# Altium footprint library Sajad_Altium_Library.PcbLib: 380 footprints (part 13 of 24)
Each footprint in its own frame and in the unit in brackets; x right, y up, seen from the top. Pads: shape width x height; smd on the part's side, far side on the other; paste and mask are expansions set on the pad; w line width, h text height; cw(c..) or ccw(c..) is an arc to the next point about the centre after c.
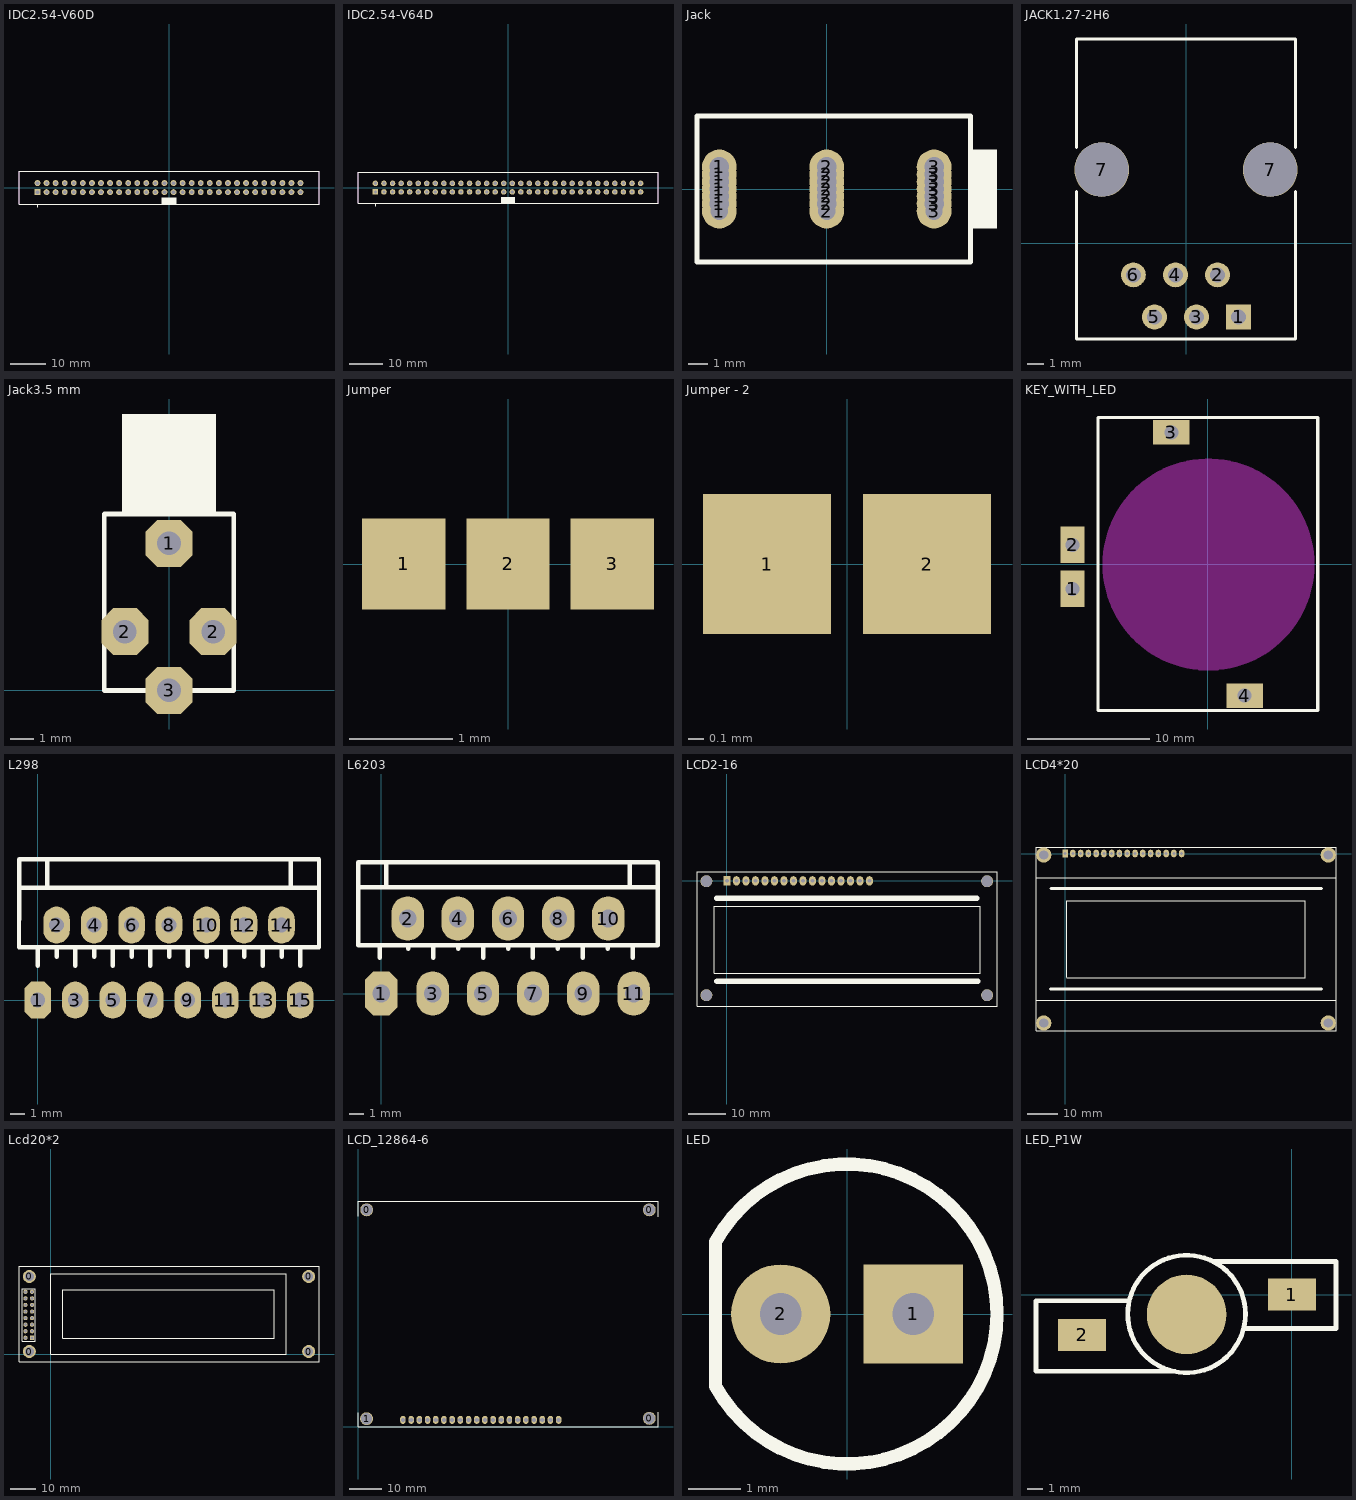
[diagram p12: the footprints below, top view; thin cyan lines are the x and y axes]

## IDC2.54-V60D [mm] "Connector; IDC, Low Profile Male Header, Thru-Hole; 60 Position; Vertical; Pitch 2.54 mm; Body 84.02 x 9.2 x 9.45 mm (LxWxH)"
height 9.45
pads (60):
  rect 1.65x1.65 hole 1: 1(-36.83,-1.27)
  round 1.65 hole 1: 2(-36.83,1.27) 3(-34.29,-1.27) 4(-34.29,1.27) 5(-31.75,-1.27) 6(-31.75,1.27) 7(-29.21,-1.27) 8(-29.21,1.27) 9(-26.67,-1.27) 10(-26.67,1.27) 11(-24.13,-1.27) 12(-24.13,1.27) 13(-21.59,-1.27) 14(-21.59,1.27) 15(-19.05,-1.27) 16(-19.05,1.27) 17(-16.51,-1.27) 18(-16.51,1.27) 19(-13.97,-1.27) 20(-13.97,1.27) 21(-11.43,-1.27) 22(-11.43,1.27) 23(-8.89,-1.27) 24(-8.89,1.27) 25(-6.35,-1.27) 26(-6.35,1.27) 27(-3.81,-1.27) 28(-3.81,1.27) 29(-1.27,-1.27) 30(-1.27,1.27) 31(1.27,-1.27) 32(1.27,1.27) 33(3.81,-1.27) 34(3.81,1.27) 35(6.35,-1.27) 36(6.35,1.27) 37(8.89,-1.27) 38(8.89,1.27) 39(11.43,-1.27) 40(11.43,1.27) 41(13.97,-1.27) 42(13.97,1.27) 43(16.51,-1.27) 44(16.51,1.27) 45(19.05,-1.27) 46(19.05,1.27) 47(21.59,-1.27) 48(21.59,1.27) 49(24.13,-1.27) 50(24.13,1.27) 51(26.67,-1.27) 52(26.67,1.27) 53(29.21,-1.27) 54(29.21,1.27) 55(31.75,-1.27) 56(31.75,1.27) 57(34.29,-1.27) 58(34.29,1.27) 59(36.83,-1.27) 60(36.83,1.27)
Top Overlay:
  circle w0.25: c-36.83,-5.25 r0.125
  rectangle: -2.05,-4.6 2.05,-2.7
  lines w0.2: -42.01,-4.6 42.01,-4.6 42.01,4.6 -42.01,4.6 -42.01,-4.6
Mechanical 13:
  lines w0.1: -42.01,-4.6 -42.01,4.6 42.01,4.6 42.01,-4.6 -42.01,-4.6
3D body: height 9.1, standoff -3, extent -42,-4.55 42,4.75

## IDC2.54-V64D [mm] "Connector; IDC, Low Profile Male Header, Thru-Hole; 64 Position; Vertical; Pitch 2.54 mm; Body 89.10 x 9.2 x 9.45 mm (LxWxH)"
height 9.45
pads (64):
  rect 1.65x1.65 hole 1: 1(-39.37,-1.27)
  round 1.65 hole 1: 2(-39.37,1.27) 3(-36.83,-1.27) 4(-36.83,1.27) 5(-34.29,-1.27) 6(-34.29,1.27) 7(-31.75,-1.27) 8(-31.75,1.27) 9(-29.21,-1.27) 10(-29.21,1.27) 11(-26.67,-1.27) 12(-26.67,1.27) 13(-24.13,-1.27) 14(-24.13,1.27) 15(-21.59,-1.27) 16(-21.59,1.27) 17(-19.05,-1.27) 18(-19.05,1.27) 19(-16.51,-1.27) 20(-16.51,1.27) 21(-13.97,-1.27) 22(-13.97,1.27) 23(-11.43,-1.27) 24(-11.43,1.27) 25(-8.89,-1.27) 26(-8.89,1.27) 27(-6.35,-1.27) 28(-6.35,1.27) 29(-3.81,-1.27) 30(-3.81,1.27) 31(-1.27,-1.27) 32(-1.27,1.27) 33(1.27,-1.27) 34(1.27,1.27) 35(3.81,-1.27) 36(3.81,1.27) 37(6.35,-1.27) 38(6.35,1.27) 39(8.89,-1.27) 40(8.89,1.27) 41(11.43,-1.27) 42(11.43,1.27) 43(13.97,-1.27) 44(13.97,1.27) 45(16.51,-1.27) 46(16.51,1.27) 47(19.05,-1.27) 48(19.05,1.27) 49(21.59,-1.27) 50(21.59,1.27) 51(24.13,-1.27) 52(24.13,1.27) 53(26.67,-1.27) 54(26.67,1.27) 55(29.21,-1.27) 56(29.21,1.27) 57(31.75,-1.27) 58(31.75,1.27) 59(34.29,-1.27) 60(34.29,1.27) 61(36.83,-1.27) 62(36.83,1.27) 63(39.37,-1.27) 64(39.37,1.27)
Top Overlay:
  circle w0.25: c-39.37,-5.25 r0.125
  rectangle: -2.05,-4.6 2.05,-2.75
  lines w0.2: -44.55,-4.6 -44.55,4.6 44.55,4.6 44.55,-4.6 -44.55,-4.6
Mechanical 13:
  lines w0.1: -44.55,-4.6 44.55,-4.6 44.55,4.6 -44.55,4.6 -44.55,-4.6
3D body: height 9.1, standoff -3, extent -44.54,-4.55 44.54,4.75

## Jack [mil] "Jack"
pads (21):
  round 70 hole 35: 1(-216.54,-44.65) 2(0,-44.65) 3(216.54,-44.65)
  round 70 hole 39.37: 1(-216.54,-29.65) 1(-216.54,-14.65) 1(-216.54,0) 1(-216.54,14.65) 1(-216.54,29.65) 1(-216.54,44.65) 2(0,-29.65) 2(0,-14.65) 2(0,0) 2(0,14.65) 2(0,29.65) 2(0,44.65) 3(216.54,-29.65) 3(216.54,-14.65) 3(216.54,0) 3(216.54,14.65) 3(216.54,29.65) 3(216.54,44.65)
Top Overlay:
  rectangle: 289.65,-80 343.46,80
  lines w10: -261.54,-147.64 289.65,-147.64 289.65,147.64 -261.54,147.64 -261.54,-147.64

## JACK1.27-2H6 [mm] "Connector; PCB Jack, Thru-Hole; 1-Port, 6 Positions, 6 Loaded; Unshielded without Lightpipes; Right Angle"
height 11.58
pads (8):
  rect 1.5x1.5 hole 0.9: 1(3.175,-4.445)
  round 1.5 hole 0.9: 2(1.905,-1.905) 3(0.635,-4.445) 4(-0.635,-1.905) 5(-1.905,-4.445) 6(-3.175,-1.905)
  round 3.3 hole 3.25 unplated: 7(-5.08,4.445) 7(5.08,4.445)
Top Overlay:
  lines w0.2: -6.605,3.113 -6.605,-5.775 6.605,-5.775 6.605,3.113 ; -6.605,5.777 -6.605,12.325 6.605,12.325 6.605,5.777
3D body: height 12.5, standoff -0.5, extent -7.214,-6.087 7.26,11.98

## Jack3.5 mm [mil] "Jack3.5 mm stereo"
pads (4):
  oct 80x80 hole 40: 1(0,250) 2(-75,100) 2(75,100) 3(0,0)
Top Overlay:
  region: 0,470 -80,470 -80,300 0,300
  rectangle: 0,300 80,470
  lines w7.87: -110,0 -110,300 110,300 110,0 -110,0

## Jumper [mil]
pads (3):
  rect 32x35 smd: 1(-40,0) 2(0,0) 3(40,0)

## Jumper - 2 [mil]
pads (2):
  rect 32x35 smd: 1(-20,0) 2(20,0)

## KEY_WITH_LED [mm] "Key with led"
pads (4):
  rect 2x3 hole 1.143: 1(-11.103,-2.032) 2(-11.103,1.575)
  rect 3x2 hole 1.143: 3(-3,10.794) 4(3,-10.794)
Top Overlay:
  lines w0.254: -9,-12 9,-12 9,12 -9,12 -9,-12
Keep-Out Layer:
  circle w0.254: c0.04,-0.047 r8.569
  board cut-out: -8.471,-0.047 -8.43,-0.881 -8.307,-1.707 -8.104,-2.517 -7.823,-3.303 -7.466,-4.058 -7.036,-4.775 -6.539,-5.446 -5.978,-6.064 -5.359,-6.625 -4.688,-7.123 -3.972,-7.552 -3.217,-7.909 -2.431,-8.191 -1.621,-8.393 -0.794,-8.516 0.04,-8.557 0.874,-8.516 1.7,-8.393 2.51,-8.191 3.296,-7.909 4.051,-7.552 4.768,-7.123 5.439,-6.625 6.057,-6.064 6.618,-5.446 7.116,-4.775 7.545,-4.058 7.902,-3.303 8.184,-2.517 8.386,-1.707 8.509,-0.881 8.55,-0.047 8.509,0.787 8.386,1.614 8.184,2.424 7.902,3.21 7.545,3.965 7.116,4.681 6.618,5.352 6.057,5.971 5.439,6.532 4.768,7.029 4.051,7.459 3.296,7.816 2.51,8.097 1.7,8.3 0.874,8.423 0.04,8.464 -0.794,8.423 -1.621,8.3 -2.431,8.097 -3.217,7.816 -3.972,7.459 -4.688,7.029 -5.359,6.532 -5.978,5.971 -6.539,5.352 -7.036,4.681 -7.466,3.965 -7.823,3.21 -8.104,2.424 -8.307,1.614 -8.43,0.787

## L298 [mm]
pads (15):
  oct 1.8x2.5 hole 1: 1(0,0)
  oval 1.8x2.5 hole 1: 2(1.27,5.08) 3(2.54,0) 4(3.81,5.08) 5(5.08,0) 6(6.35,5.08) 7(7.62,0) 8(8.89,5.08) 9(10.16,0) 10(11.43,5.08) 11(12.7,0) 12(13.97,5.08) 13(15.24,0) 14(16.51,5.08) 15(17.78,0)
Top Overlay:
  lines w0.305: -1.274,3.579 -1.27,7.197 -1.27,9.525 19.05,9.525 19.05,7.62 ; -1.27,3.579 19.05,3.579 19.05,7.62 ; -1.27,7.62 19.05,7.62 ; 0,2.309 0,3.579 ; 0.635,7.62 0.635,9.525 ; 1.27,2.944 1.27,3.579 ; 2.54,2.309 2.54,3.579 ; 3.81,2.944 3.81,3.579 ; 5.08,2.309 5.08,3.579 ; 6.35,2.944 6.35,3.579 ; 7.62,2.309 7.62,3.579 ; 8.89,2.944 8.89,3.579 ; 10.16,2.309 10.16,3.579 ; 11.43,2.944 11.43,3.579 ; 12.7,2.309 12.7,3.579 ; 13.97,2.944 13.97,3.579 ; 15.24,2.309 15.24,3.579 ; 16.51,2.944 16.51,3.579 ; 17.145,7.62 17.145,9.525 ; 17.78,2.309 17.78,3.579

## L6203 [mm]
pads (11):
  oct 2.2x3 hole 1.2: 1(0,0)
  oval 2.2x3 hole 1.2: 2(1.799,5.08) 3(3.492,0) 4(5.186,5.08) 5(6.9,0) 6(8.594,5.08) 7(10.287,0) 8(12.001,5.08) 9(13.695,0) 10(15.388,5.08) 11(17.103,0)
Top Overlay:
  lines w0.305: -0.085,2.41 -0.085,3.257 ; 0.339,7.197 0.339,8.89 ; 1.82,3.045 1.82,3.257 ; 3.514,2.41 3.514,3.257 ; 5.207,3.045 5.207,3.257 ; 6.9,2.41 6.9,3.257 ; 8.594,3.045 8.594,3.257 ; 10.287,2.41 10.287,3.257 ; 11.98,3.045 11.98,3.257 ; 13.674,2.41 13.674,3.257 ; 15.367,3.045 15.367,3.257 ; 16.849,7.197 16.849,8.89 ; 17.06,2.41 17.06,3.257 ; -1.566,7.197 18.754,7.197 ; -1.566,7.197 -1.566,3.257 18.754,3.257 18.754,7.197 ; -1.566,7.197 -1.566,8.89 18.754,8.89 18.754,7.197

## LCD2-16 [mm]
pads (20):
  rect 1.8x2.5 hole 1: 1(0,0)
  oval 1.8x2.5 hole 1: 2(2.54,0) 3(5.08,0) 4(7.62,0) 5(10.16,0) 6(12.7,0) 7(15.24,0) 8(17.78,0) 9(20.32,0) 10(22.86,0) 11(25.4,0) 12(27.94,0) 13(30.48,0) 14(33.02,0) 15(35.56,0) 16(38.1,0)
  round 3.2 hole 3: ""(-5.486,-30.582) ""(-5.486,-0.102) ""(69.571,-30.582) ""(69.571,-0.102)
Top Overlay:
  lines w0.3: -3.378,-6.96 -3.378,-6.833 67.742,-6.833 67.742,-24.664 -3.378,-24.664 -3.378,-6.909
  lines w0.305: -8.001,-33.503 -8.001,2.413 72.213,2.413 72.213,-33.503 -8.001,-33.503
  lines w1.5: -2.717,-4.598 66.777,-4.598 ; -2.641,-26.797 67.031,-26.797

## LCD4*20 [mm]
pads (20):
  rect 1.8x2.5 hole 1: 1(0,0)
  oval 1.8x2.5 hole 1: 2(2.54,0) 3(5.08,0) 4(7.62,0) 5(10.16,0) 6(12.7,0) 7(15.24,0) 8(17.78,0) 9(20.32,0) 10(22.86,0) 11(25.4,0) 12(27.94,0) 13(30.48,0) 14(33.02,0) 15(35.56,0) 16(38.1,0)
  round 5 hole 3: ""(-6.985,-55.398) ""(-6.985,-0.483) ""(86.03,-55.398) ""(86.03,-0.483)
Top Overlay:
  lines w0.305: -9.5,-8.001 88.494,-8.001 ; -9.449,-47.981 88.494,-47.981 ; 0.584,-40.488 0.584,-15.418 78.537,-15.418 ; 0.61,-40.538 78.537,-40.538 ; 78.537,-40.513 78.537,-15.443 ; -9.5,-57.912 -9.5,2.032 88.544,2.032 88.544,-57.912 -9.5,-57.912
  lines w1: -4.674,-44.298 83.795,-44.298 ; -4.572,-11.455 83.795,-11.455

## Lcd20*2 [mm]
pads (20):
  round 5 hole 3.5: 0(-8.2,1.1) 0(-8.2,30.1) 0(99.8,1.1) 0(99.8,30.1)
  rect 1.651x1.651 hole 1.143: 1(-7.16,6.4)
  round 1.651 hole 1.143: 2(-9.7,6.4) 3(-7.16,8.94) 4(-9.7,8.94) 5(-7.16,11.48) 6(-9.7,11.48) 7(-7.16,14.02) 8(-9.7,14.02) 9(-7.16,16.56) 10(-9.7,16.56) 11(-7.16,19.1) 12(-9.7,19.1) 13(-7.16,21.64) 14(-9.7,21.64) 15(-7.16,24.18) 16(-9.7,24.18)
Top Overlay:
  lines w0.254: -12.2,-2.9 103.8,-2.9 103.8,34.1 -12.2,34.1 -12.2,-2.9 ; -10.97,5.13 -10.97,25.45 -5.89,25.45 -5.89,5.13 -10.97,5.13 ; 0,0 91.2,0 91.2,31.2 0,31.2 0,0 ; 4.8,6.3 86.4,6.3 86.4,24.9 4.8,24.9 4.8,6.3
3D body: height 5.03, standoff -4.57, extent -12.239,-2.942 103.839,34.396

## LCD_12864-6 [mm] "SLYABBA"
pads (24):
  round 4 hole 3.5: 0(2.7,67.3) 0(90.297,2.667) 0(90.3,67.3) 1(2.667,2.54)
  oval 1.7x2.5 hole 1.3: 1(62.2,2.183) 2(59.66,2.183) 3(57.12,2.183) 4(54.58,2.183) 5(52.04,2.183) 6(49.5,2.183) 7(46.96,2.183) 8(44.42,2.183) 9(41.88,2.183) 10(39.34,2.183) 11(36.8,2.183) 12(34.26,2.183) 13(31.72,2.183) 14(29.18,2.183) 15(26.64,2.183) 16(24.1,2.183) 17(21.56,2.183) 18(19.02,2.183) 19(16.48,2.183) 20(13.94,2.183)
Top Overlay:
  lines w0.25: 0,0 0,4.445 ; 0,65.278 0,69.977 92.977,69.977 93,70 93,65.187 ; 93,0 93,4.536
  lines w0.254: 0,0 93,0

## LED [mm]
pads (2):
  rect 1.9x1.9 hole 0.8: 1(1.27,0)
  round 1.9 hole 0.8: 2(-1.27,0)
Top Overlay:
  lines w0.254: -2.518,-1.385 ccw(c0,0) -2.518,1.385 -2.518,-1.385
3D body: height 8.79, standoff -6.81, extent -2.95,-2.95 2.95,2.95

## LED_P1W [mm]
pads (3):
  rect 3x2 smd: 1(0,0) 2(-13.208,-2.54)
  round 5 smd: ""(-6.629,-1.244)
Top Overlay:
  circle w0.3: c-6.629,-1.219 r3.7
  lines w0.3: -10.287,-0.381 -16.103,-0.381 -16.103,-4.826 -7.366,-4.826 ; -4.978,2.083 1.372,2.083 ; -2.971,-2.133 2.769,-2.133 2.769,2.083 1.296,2.083